# Altium footprint library USB-Mini_USB-Micro_USB.PcbLib: 33 footprints (part 1 of 3)
Each footprint in its own frame and in the unit in brackets; x right, y up, seen from the top. Pads: shape width x height; smd on the part's side, far side on the other; paste and mask are expansions set on the pad; w line width, h text height; cw(c..) or ccw(c..) is an arc to the next point about the centre after c.
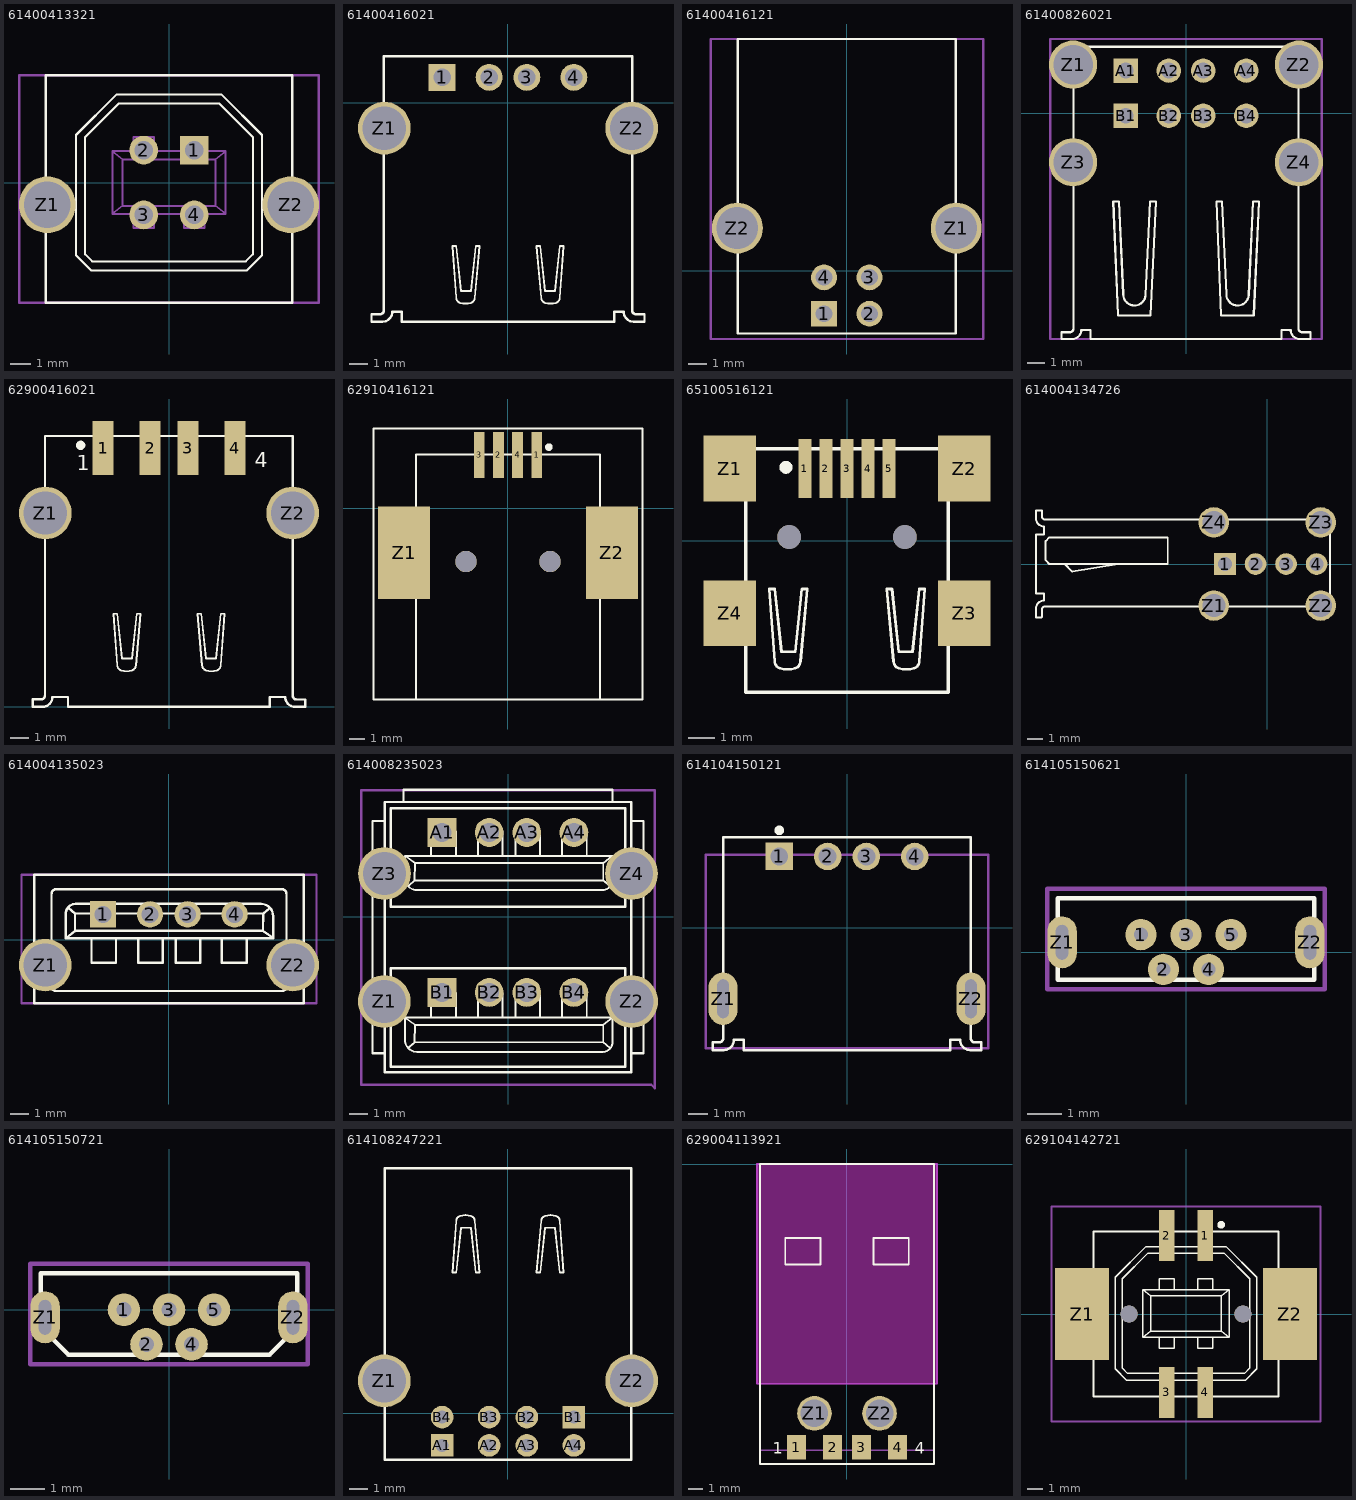
[diagram p0: the footprints below, top view; thin cyan lines are the x and y axes]

## 61400413321 [mm] "F Str 04p Btype vertical"
height 16.1
pads (6):
  rect 1.428x1.428 hole 0.92: 1(1.25,1.6)
  round 1.428 hole 0.92: 2(-1.25,1.6) 3(-1.25,-1.6) 4(1.25,-1.6)
  round 2.8 hole 2.3: Z1(-6.02,-1.1) Z2(6.02,-1.1)
Top Overlay:
  lines w0.102: -4.6,-3.6 -3.85,-4.35 3.85,-4.35 4.6,-3.6 4.6,2.35 2.6,4.35 -2.6,4.35 -4.6,2.35 -4.6,-3.6 ; -4.15,-3.55 -3.8,-3.9 3.8,-3.9 4.15,-3.55 4.15,2.25 2.5,3.9 -2.5,3.9 -4.15,2.25 -4.15,-3.55
  lines w0.127: -6.1,-5.945 -6.1,5.305 6.1,5.305 6.1,-5.945 -6.1,-5.945
Mechanical 13:
  lines w0.102: -1.75,-1.55 -1.75,-2.25 -0.75,-2.25 -0.75,-1.55 ; -1.75,1.55 -1.75,2.25 -0.75,2.25 -0.75,1.55 ; 0.75,-1.55 0.75,-2.25 1.75,-2.25 1.75,-1.55 ; 0.75,1.55 0.75,2.25 1.75,2.25 1.75,1.55 ; -2.8,-1.55 2.8,-1.55 ; -2.8,-1.55 -2.8,1.55 ; -2.8,-1.55 -2.3,-1.15 ; -2.8,1.55 2.8,1.55 ; -2.8,1.55 -2.3,1.15 ; -2.3,-1.15 2.3,-1.15 ; -2.3,-1.15 -2.3,1.15 ; -2.3,1.15 2.3,1.15 ; 2.3,-1.15 2.3,1.15 ; 2.3,-1.15 2.8,-1.55 ; 2.3,1.15 2.8,1.55 ; 2.8,-1.55 2.8,1.55
Mechanical 15:
  lines w0.127: -7.398,-5.945 7.4,-5.945 7.4,5.305 -7.398,5.305 -7.398,-5.945
3D body: height 16.11, standoff -4.21, extent -7.398,-5.945 7.398,5.255

## 61400416021 [mm] "4 pins"
height 6.95
pads (6):
  rect 1.428x1.428 hole 0.92: 1(-3.5,1.35)
  round 1.428 hole 0.92: 2(-1,1.35) 3(1,1.35) 4(3.5,1.35)
  round 2.8 hole 2.3: Z1(-6.57,-1.35) Z2(6.57,-1.35)
Top Overlay:
  lines w0.102: -2.544,-10.628 cw(c-2.457,-10.346) -2.751,-10.369 -2.959,-7.617 -2.751,-7.617 -2.492,-10.005 -1.973,-10.005 -1.713,-7.617 -1.505,-7.617 -1.765,-10.369 cw(c-2.059,-10.346) -1.973,-10.628 ; -2.544,-10.628 ccw(c-2.258,-9.697) -1.973,-10.628 ; 1.973,-10.628 cw(c2.059,-10.346) 1.765,-10.369 1.505,-7.617 1.713,-7.617 1.973,-10.005 2.492,-10.005 2.751,-7.617 2.959,-7.617 2.751,-10.369 cw(c2.457,-10.346) 2.544,-10.628 ; 1.973,-10.628 ccw(c2.258,-9.697) 2.544,-10.628
  lines w0.127: -7.25,-11.625 -7.25,-11.23 -6.798,-11.23 ccw(c-6.798,-11.033) -6.601,-11.033 -6.6,2.47 6.6,2.47 6.6,-11.033 ccw(c6.798,-11.033) 6.798,-11.23 7.25,-11.23 7.25,-11.625 6.666,-11.625 cw(c6.666,-11.098) 6.14,-11.098 5.64,-11.098 5.64,-11.63 -5.64,-11.63 -5.64,-11.098 -6.14,-11.098 cw(c-6.666,-11.098) -6.666,-11.625 -7.25,-11.625
3D body: height 7.71, standoff -3.69, extent -7.9,-11.63 7.9,2.47

## 61400416121 [mm] "WR-COM Horizontal USB Type B    4 pins"
height 10.7
pads (6):
  rect 1.42x1.42 hole 0.92: 1(-1.25,-2.355)
  round 1.42 hole 0.92: 2(1.25,-2.355) 3(1.25,-0.355) 4(-1.25,-0.355)
  round 2.8 hole 2.3: Z1(6.02,2.355) Z2(-6.02,2.355)
Top Overlay:
  lines w0.127: -6,-3.445 6,-3.445 6,12.755 -6,12.755 -6,-3.445
Mechanical 15:
  lines w0.127: -7.475,-3.745 7.5,-3.745 7.5,12.755 -7.475,12.755 -7.475,-3.745
3D body: height 10.96, standoff -4.04, extent -7.35,-3.745 7.35,12.755

## 61400826021 [mm] "2 x 4 pins"
height 15.34
pads (12):
  rect 1.42x1.42 hole 0.92: A1(-3.5,2.49) B1(-3.5,-0.13)
  round 1.42 hole 0.92: A2(-1,2.49) A3(1,2.49) A4(3.5,2.49) B2(-1,-0.13) B3(1,-0.13) B4(3.5,-0.13)
  round 2.8 hole 2.3: Z1(-6.57,2.84) Z2(6.57,2.84) Z3(-6.57,-2.84) Z4(6.57,-2.84)
Top Overlay:
  lines w0.127: -3.962,-11.748 -4.234,-5.119 -3.901,-5.119 ; -3.961,-11.747 -2.059,-11.747 -1.75,-5.12 -2.1,-5.12 -2.35,-10.57 cw(c-3,-10.52) -3.652,-10.534 -3.9,-5.12 ; 2.099,-5.119 1.766,-5.119 2.038,-11.748 3.94,-11.748 ; 2.1,-5.12 2.348,-10.534 ccw(c3,-10.52) 3.65,-10.57 3.9,-5.12 4.25,-5.12 3.941,-11.747 ; 6.55,-12.528 6.55,3.88 -6.55,3.88 -6.55,-12.528 cw(c-6.748,-12.528) -6.748,-12.725 -7.25,-12.725 -7.25,-13.12 -6.616,-13.12 ccw(c-6.616,-12.594) -6.09,-12.594 -5.56,-12.594 -5.56,-13.12 5.56,-13.12 5.56,-12.594 6.09,-12.594 ccw(c6.616,-12.594) 6.616,-13.12 7.25,-13.12 7.25,-12.725 6.748,-12.725 cw(c6.748,-12.528) 6.55,-12.528
Mechanical 15:
  lines w0.127: -7.9,-13.12 7.9,-13.12 7.9,4.33 -7.9,4.33 -7.9,-13.12
3D body: height 16.15, standoff -3.75, extent -7.895,-13.12 7.895,4.03

## 62900416021 [mm] "4 pins"
height 6.72
pads (6):
  rect 1.12x2.88 smd: 1(-3.525,13.755) 2(-1.025,13.755) 3(0.975,13.755) 4(3.475,13.755)
  round 2.8 hole 2.3: Z1(-6.6,10.305) Z2(6.55,10.305)
Top Overlay:
  circle w0.254: c-4.72,13.905 r0.12
  lines w0.102: -2.984,4.948 -2.776,4.948 -2.517,2.56 -1.998,2.56 -1.738,4.948 -1.53,4.948 -1.79,2.197 cw(c-2.084,2.219) -1.998,1.937 cw(c-2.283,2.868) -2.569,1.937 cw(c-2.482,2.219) -2.776,2.197 -2.984,4.948 ; 1.48,4.948 1.688,4.948 1.948,2.56 2.467,2.56 2.726,4.948 2.934,4.948 2.726,2.197 cw(c2.432,2.219) 2.519,1.937 cw(c2.233,2.868) 1.948,1.937 cw(c2.034,2.219) 1.74,2.197 1.48,4.948
  lines w0.127: -6.817,0.395 -7.275,0.395 -7.275,0 -6.748,0 ccw(c-6.748,0.527) -6.222,0.527 -5.395,0.527 -5.395,0 5.33,0 5.33,0.522 6.157,0.522 ccw(c6.683,0.522) 6.683,-0.005 7.21,-0.005 7.21,0.39 6.752,0.39 ; -6.817,0.398 ccw(c-6.817,0.595) -6.62,0.595 -6.62,14.4 6.55,14.4 6.55,0.605 ; 6.555,0.59 ccw(c6.752,0.59) 6.752,0.393
  text "4" at 4.525,12.73 h0.8
  text "1" at -4.925,12.58 h0.8
3D body: height 7.5, standoff -3.71, extent -7.773,-0.05 7.723,15.155

## 62910416121 [mm] "4 pins"
height 10.7
pads (8):
  rect 0.7x3 smd: 1(1.875,3.49) 2(-0.625,3.49) 3(-1.875,3.49) 4(0.625,3.49)
  rect 3.4x6.04 smd: Z1(-6.8,-2.91) Z2(6.8,-2.91)
  round 1.4 hole 1.4 unplated: ""(-2.75,-3.49) ""(2.75,-3.49)
Top Overlay:
  circle w0.254: c2.68,4 r0.12
  lines w0.127: -8.8,-12.51 -8.8,5.21 8.8,5.21 8.8,-12.51 -8.8,-12.51 ; -6.02,-12.51 6.02,-12.51 6.02,3.51 -6.02,3.51 -6.02,-12.51
Mechanical 13:
  text "1" at 1.8,1.2 h1
  text "4" at 0.4,1.2 h1
  text "2" at -0.8,1.2 h1
  text "3" at -2,1.2 h1
3D body: height 10.93, standoff -0.69, extent -8.1,-12.51 8.1,4.49

## 65100516121 [mm] "5 pins"
height 3.9
pads (11):
  rect 0.5x2.25 smd: 1(-1.6,2.75) 2(-0.8,2.75) 3(0,2.75) 4(0.8,2.75) 5(1.6,2.75)
  rect 2x2.5 smd: Z1(-4.45,2.75) Z2(4.45,2.75) Z3(4.45,-2.75) Z4(-4.45,-2.75)
  round 0.9 hole 0.9 unplated: ""(-2.2,0.15) ""(2.2,0.15)
Top Overlay:
  circle w0.254: c-2.32,2.8 r0.12
  lines w0.102: -2.959,-1.827 -2.751,-1.827 -2.492,-4.215 -1.973,-4.215 -1.713,-1.827 -1.505,-1.827 -1.765,-4.578 cw(c-2.059,-4.556) -1.973,-4.838 cw(c-2.258,-3.907) -2.544,-4.838 cw(c-2.457,-4.556) -2.751,-4.578 -2.959,-1.827 ; 1.505,-1.827 1.713,-1.827 1.973,-4.215 2.492,-4.215 2.751,-1.827 2.959,-1.827 2.751,-4.578 cw(c2.457,-4.556) 2.544,-4.838 cw(c2.258,-3.907) 1.973,-4.838 cw(c2.059,-4.556) 1.765,-4.578 1.505,-1.827
  lines w0.127: -3.85,-5.75 -3.85,3.5 3.85,3.5 3.85,-5.75 -3.85,-5.75
3D body: height 3.97, standoff -0.93, extent -4.8,-5.75 4.8,3.5

## 614004134726 [mm] "4 pins"
height 14.5
pads (8):
  rect 1.42x1.42 hole 0.92: 1(-2.77,0)
  round 1.42 hole 0.92: 2(-0.77,0) 3(1.23,0) 4(3.23,0)
  round 2 hole 1.5: Z1(-3.5,-2.72) Z2(3.5,-2.72) Z3(3.5,2.72) Z4(-3.5,2.72)
Top Overlay:
  lines w0.127: -14.59,2.92 4.1,2.92 ; -14.558,-2.79 4.095,-2.79 ; -14.558,-2.786 ccw(c-14.558,-2.983) -14.755,-2.983 -14.755,-3.444 cw(c-14.821,-3.444) -14.821,-3.51 -15.15,-3.51 -15.15,-2.918 cw(c-14.624,-2.918) -14.624,-2.391 -14.624,-1.93 -15.15,-1.93 -15.15,1.93 -14.624,1.93 -14.624,2.457 cw(c-14.624,2.983) -15.15,2.983 -15.15,3.51 -14.755,3.51 -14.755,3.115 ccw(c-14.558,3.115) -14.558,2.918 ; 4.1,-2.79 4.1,2.913 ; -13.27,0 -14.27,0 -14.52,0.25 -14.52,1.5 -14.27,1.75 -6.52,1.75 -6.52,0 -9.77,0 ; -13.27,0 -9.77,0 ; -13.27,0 -12.77,-0.5 -9.77,0
3D body: height 3.4, standoff -14.89, extent -15.18,-3.55 4.12,3.55

## 614004135023 [mm] "4 pins"
height 14.9
pads (6):
  rect 1.4x1.4 hole 0.9: 1(-3.51,1.35)
  round 1.4 hole 0.9: 2(-1.01,1.35) 3(0.99,1.35) 4(3.49,1.35)
  round 2.8 hole 2.3: Z1(-6.58,-1.35) Z2(6.58,-1.35)
Top Overlay:
  lines w0.127: -6.25,-2.505 -6.25,2.445 cw(c-6,2.445) -6,2.695 6,2.695 cw(c6,2.445) 6.25,2.445 6.25,-2.475 cw(c6,-2.475) 6,-2.725 -6.03,-2.725 ; -6.25,-2.475 ccw(c-6,-2.475) -6,-2.725 ; -5.345,1.696 -5.002,1.396 ; -4.124,0.068 -4.124,-1.217 -2.817,-1.217 -2.817,0.068 ; -1.639,0.068 -1.639,-1.217 -0.333,-1.217 -0.333,0.046 ; 0.353,0.025 0.353,-1.217 1.659,-1.217 1.659,0.068 1.681,0.068 ; 2.816,0.046 2.816,-1.217 4.144,-1.217 4.144,0.046 ; 5.343,1.674 5.022,1.396 ; -5.473,0.089 5.536,0.089 ; -5.473,0.089 -5.494,0.089 -5.494,1.374 cw(c-4.959,1.374) -4.959,1.91 4.893,1.91 cw(c4.893,1.267) 5.536,1.267 5.536,0.089 ; -5.473,0.089 -5.002,0.475 ; -5.002,0.475 5,0.475 ; -5.002,0.475 -5.002,1.396 ; -5.002,1.396 5.022,1.396 ; 5,0.475 5.536,0.089 ; 5,0.475 5.022,1.396 ; -7.175,-3.38 -7.175,3.46 7.175,3.46 7.175,-3.38 -7.175,-3.38
Mechanical 15:
  lines w0.127: -7.85,-3.38 -7.85,3.46 7.85,3.46 7.85,-3.38 -7.85,-3.38
3D body: height 3.47, standoff -15.33, extent -7.85,-3.38 7.85,3.46

## 614008235023 [mm] "2 x 4 pins"
height 16.9
pads (12):
  rect 1.53x1.53 hole 1.02: A1(-3.5,4.49) B1(-3.5,-4.01)
  round 1.53 hole 1.02: A2(-1,4.49) A3(1,4.49) A4(3.5,4.49) B2(-1,-4.01) B3(1,-4.01) B4(3.5,-4.01)
  round 2.8 hole 2.3: Z1(-6.57,-4.49) Z2(6.57,-4.49) Z3(-6.565,2.31) Z4(6.565,2.31)
Top Overlay:
  lines w0.102: -5.283,-6.934 -4.962,-6.656 ; -5.283,1.666 -4.962,1.944 ; -4.084,-5.306 -4.084,-4.043 -2.756,-4.043 -2.756,-5.306 ; -4.084,3.294 -4.084,4.557 -2.756,4.557 -2.756,3.294 ; -1.621,-5.328 -1.599,-5.328 -1.599,-4.043 -0.293,-4.043 -0.293,-5.285 ; -1.621,3.272 -1.599,3.272 -1.599,4.557 -0.293,4.557 -0.293,3.315 ; 0.393,-5.306 0.393,-4.043 1.699,-4.043 1.699,-5.328 ; 0.393,3.294 0.393,4.557 1.699,4.557 1.699,3.272 ; 2.877,-5.328 2.877,-4.043 4.184,-4.043 4.184,-5.328 ; 2.877,3.272 2.877,4.557 4.184,4.557 4.184,3.272 ; 5.405,-6.955 5.062,-6.656 ; 5.405,1.645 5.062,1.944 ; -5.476,-5.349 -4.94,-5.735 ; -5.476,-5.349 -5.476,-6.527 ccw(c-4.833,-6.527) -4.833,-7.17 5.019,-7.17 ccw(c5.019,-6.634) 5.554,-6.634 5.554,-5.349 5.533,-5.349 ; -5.476,-5.349 5.533,-5.349 ; -5.476,3.251 -4.94,2.865 ; -5.476,3.251 -5.476,2.073 ccw(c-4.833,2.073) -4.833,1.43 5.019,1.43 ccw(c5.019,1.966) 5.554,1.966 5.554,3.251 5.533,3.251 ; -5.476,3.251 5.533,3.251 ; -4.962,-6.656 5.062,-6.656 ; -4.962,-6.656 -4.94,-5.735 ; -4.962,1.944 5.062,1.944 ; -4.962,1.944 -4.94,2.865 ; -4.94,-5.735 5.062,-5.735 ; -4.94,2.865 5.062,2.865 ; 5.062,-6.656 5.062,-5.735 ; 5.062,-5.735 5.533,-5.349 ; 5.062,1.944 5.062,2.865 ; 5.062,2.865 5.533,3.251
  lines w0.127: -6.55,-7.24 -7.201,-7.24 -7.2,5.1 -6.55,5.1 ; -5.55,6.11 -5.55,6.76 5.55,6.76 5.55,6.11 ; 6.55,-7.24 7.2,-7.24 7.2,5.1 6.55,5.1 ; -6.55,-8.24 -6.55,6.11 6.55,6.11 6.55,-8.24 -6.55,-8.24 ; -6.221,-7.965 6.22,-7.965 6.22,-2.72 -6.221,-2.72 -6.221,-7.965 ; -6.221,0.535 -6.221,5.78 6.22,5.78 6.22,0.535 -6.221,0.535
Mechanical 15:
  lines w0.127: -7.8,-8.915 -7.8,6.735 7.8,6.735 7.8,-9.1 7.615,-8.915 -7.8,-8.915
3D body: height 16.9, standoff -3.6, extent -7.8,-8.89 7.8,6.76

## 614104150121 [mm] "WR-COM_USB_Type A_Reverse Horizontal_THT Type A Reverse Horizontal THT - with Clips - Slim type for PCB thickness 1.20mm"
height 6.82
pads (6):
  rect 1.42x1.42 hole 0.92: 1(-3.5,3.675)
  round 1.42 hole 0.92: 2(-1,3.675) 3(1,3.675) 4(3.5,3.675)
  oval 1.5x2.7 hole 0.6 slot 2 at 90 deg: Z1(-6.4,-3.675) Z2(6.4,-3.675)
Top Overlay:
  circle w0.25: c-3.5,5.025 r0.125
  lines w0.127: 5.34,-6.326 5.34,-5.799 5.84,-5.799 ccw(c6.367,-5.799) 6.367,-6.326 6.948,-6.326 6.948,-5.934 6.606,-5.934 cw(c6.606,-5.728) 6.4,-5.728 ; 5.34,-6.325 -5.34,-6.325 -5.34,-5.798 -5.84,-5.798 cw(c-6.367,-5.798) -6.367,-6.325 -6.948,-6.325 -6.948,-5.933 -6.606,-5.933 ccw(c-6.606,-5.727) -6.4,-5.727 -6.4,4.675 6.4,4.675 6.4,-5.728
Mechanical 13:
  lines w0.127: -7.3,-6.225 7.3,-6.225 7.3,3.775 -7.3,3.775 -7.3,-6.225
3D body: height 7.22, standoff -1.6, extent -7.3,-6.225 7.3,3.775

## 614105150621 [mm] "WR-COM_USB_Micro Type AB_Vertical_THT Micro Type AB Vertical THT"
height 5.61
pads (7):
  round 0.9 hole 0.4: 1(-1.3,0.5) 2(-0.65,-0.5) 3(0,0.5) 4(0.65,-0.5) 5(1.3,0.5)
  oval 0.85x1.5 hole 0.35 slot 1 at 90 deg: Z1(-3.575,0.28) Z2(3.575,0.28)
Top Overlay:
  lines w0.127: -3.7,-0.8 -3.7,1.55 3.7,1.55 3.7,-0.8 -3.7,-0.8
Mechanical 15:
  lines w0.127: -4,-1.075 -4,1.825 4,1.825 4,-1.075 -4,-1.075
3D body: height 5.61, standoff -1.5, extent -3.995,-1.075 4.005,1.825

## 614105150721 [mm] "WR-COM_USB_Micro Type B_Vertical_THT Micro Type B Vertical THT"
height 5.61
pads (7):
  round 0.94 hole 0.44: 1(-1.3,0) 2(-0.65,-1) 3(0,0) 4(0.65,-1) 5(1.3,0)
  oval 0.85x1.5 hole 0.35 slot 1 at 90 deg: Z1(-3.575,-0.22) Z2(3.575,-0.22)
Top Overlay:
  lines w0.127: -3.7,-0.5 -3.7,1.05 3.7,1.05 3.7,-0.5 2.9,-1.3 -2.9,-1.3 -3.7,-0.5
Mechanical 15:
  lines w0.127: -4,-1.575 4,-1.575 4,1.325 -4,1.325 -4,-1.575
3D body: height 5.62, standoff -1.53, extent -3.995,-1.575 4.005,1.325

## 614108247221 [mm] "WR-COM USB_Reversible_Type A_Horizontal_THT_Black"
height 7
pads (10):
  rect 1.208x1.208 hole 0.7: A1(-3.5,-1.715) B1(3.5,-0.215)
  round 1.208 hole 0.7: A2(-1,-1.715) A3(1,-1.715) A4(3.5,-1.715) B2(1,-0.215) B3(-1,-0.215) B4(-3.5,-0.215)
  round 2.8 hole 2.3: Z1(-6.57,1.715) Z2(6.57,1.715)
Top Overlay:
  lines w0.102: -2.543,10.473 ccw(c-2.457,10.191) -2.751,10.214 -2.959,7.462 -2.751,7.462 -2.492,9.85 -1.973,9.85 -1.713,7.462 -1.505,7.462 -1.765,10.214 ccw(c-2.059,10.191) -1.972,10.473 ; -2.544,10.473 cw(c-2.258,9.542) -1.973,10.473 ; 1.973,10.473 ccw(c2.059,10.191) 1.765,10.214 1.505,7.462 1.713,7.462 1.973,9.85 2.492,9.85 2.751,7.462 2.959,7.462 2.751,10.214 ccw(c2.457,10.191) 2.544,10.473 ; 1.973,10.473 cw(c2.258,9.542) 2.544,10.473
  lines w0.127: -6.55,-2.485 6.55,-2.485 6.55,13.015 -6.55,13.015 -6.55,-2.485
3D body: height 8.11, standoff -3.34, extent -7.72,-2.5 7.719,13

## 629004113921 [mm] "4 pins"
height 2.65
pads (6):
  rect 1.3x1.7 smd: 1(-3.5,-19.6) 2(-1,-19.6) 3(1,-19.6) 4(3.5,-19.6)
  round 2.4 hole 1.9: Z1(-2.25,-17.25) Z2(2.25,-17.25)
Top Overlay:
  lines w0.127: -6.025,-20.75 -6.025,0 6.025,0 6.025,-20.75 -6.025,-20.75 ; -4.275,-6.95 -1.825,-6.95 -1.825,-5.125 -4.275,-5.125 -4.275,-6.95 ; 1.825,-6.95 4.275,-6.95 4.275,-5.125 1.825,-5.125 1.825,-6.95
  text "1" at -5.12,-20.035 h0.8
  text "4" at 4.69,-20.035 h0.8
Keep-Out Layer:
  board cut-out: -6.225,0 6.225,0 6.225,-15.2 -6.225,-15.2
Mechanical 1:
  text "Milling Area" at -3.35,-10.675 h1.52
Mechanical 1 keep-out:
  lines w0.127: -6.225,-15.2 -6.225,0 6.225,0 6.225,-15.2 -6.225,-15.2
Mechanical 13:
  lines w0.127: -6.025,-19.8 -6.025,0 6.025,0 6.025,-19.8 -6.025,-19.8
3D body: height 1.86, standoff -2.64, extent -6.025,-19.8 6.025,0

## 629104142721 [mm] "4 pins Vertical with Capton"
height 10.7
pads (8):
  rect 1x3.3 smd: 1(1.25,5.1) 2(-1.25,5.1) 3(-1.25,-5.1) 4(1.25,-5.1)
  rect 3.5x6 smd: Z1(-6.75,0) Z2(6.75,0)
  round 1.1 hole 1.1 unplated: ""(-3.7,0) ""(3.7,0)
Top Overlay:
  circle w0.254: c2.28,5.8 r0.12
  lines w0.102: -1.75,-1.565 -1.75,-2.215 -0.75,-2.215 -0.75,-1.565 ; -1.75,1.635 -1.75,2.285 -0.75,2.285 -0.75,1.635 ; 0.75,-1.565 0.75,-2.215 1.75,-2.215 1.75,-1.565 ; 0.75,1.635 0.75,2.285 1.75,2.285 1.75,1.635 ; -2.8,-1.515 2.8,-1.515 ; -2.8,-1.515 -2.8,1.585 ; -2.8,-1.515 -2.3,-1.115 ; -2.8,1.585 2.8,1.585 ; -2.8,1.585 -2.3,1.185 ; -2.3,-1.115 2.3,-1.115 ; -2.3,-1.115 -2.3,1.185 ; -2.3,1.185 2.3,1.185 ; 2.3,-1.115 2.3,1.185 ; 2.3,-1.115 2.8,-1.515 ; 2.3,1.185 2.8,1.585 ; 2.8,-1.515 2.8,1.585 ; -4.6,-3.565 -3.85,-4.315 3.85,-4.315 4.6,-3.565 4.6,2.385 2.6,4.385 -2.6,4.385 -4.6,2.385 -4.6,-3.565 ; -4.15,-3.515 -3.8,-3.865 3.8,-3.865 4.15,-3.515 4.15,2.285 2.5,3.935 -2.5,3.935 -4.15,2.285 -4.15,-3.515
  lines w0.127: -6,-5.375 -6,5.375 6,5.375 6,-5.375 -6,-5.375
Mechanical 15:
  lines w0.127: -8.75,-7 8.75,-7 8.75,7 -8.75,7 -8.75,-7
3D body: height 15.02, standoff -1.07, extent -8.1,-6.1 8.1,6.1